# Altium footprint library 7-Connectors-7.PcbLib: 35 footprints (part 1 of 4)
Each footprint in its own frame and in the unit in brackets; x right, y up, seen from the top. Pads: shape width x height; smd on the part's side, far side on the other; paste and mask are expansions set on the pad; w line width, h text height; cw(c..) or ccw(c..) is an arc to the next point about the centre after c.
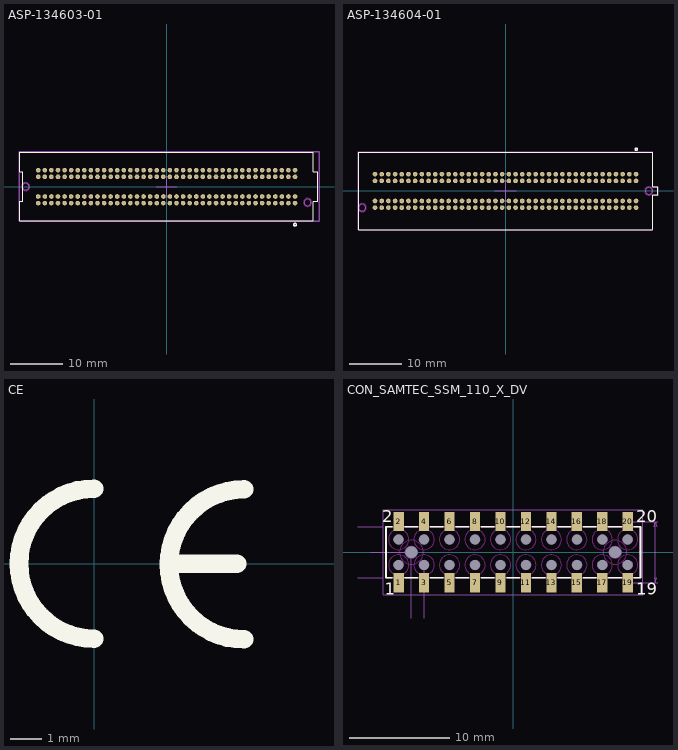
[diagram p0: the footprints below, top view; thin cyan lines are the x and y axes]

## ASP-134603-01 [mm] "母坐"
height 6.72
pads (160):
  round 0.89 hole 0.254: C1(24.765,-3.175) C2(23.495,-3.175) C3(22.225,-3.175) C4(20.955,-3.175) C5(19.685,-3.175) C6(18.415,-3.175) C7(17.145,-3.175) C8(15.875,-3.175) C9(14.605,-3.175) C10(13.335,-3.175) C11(12.065,-3.175) C12(10.795,-3.175) C13(9.525,-3.175) C14(8.255,-3.175) C15(6.985,-3.175) C16(5.715,-3.175) C17(4.445,-3.175) C18(3.175,-3.175) C19(1.905,-3.175) C20(0.635,-3.175) C21(-0.635,-3.175) C22(-1.905,-3.175) C23(-3.175,-3.175) C24(-4.445,-3.175) C25(-5.715,-3.175) C26(-6.985,-3.175) C27(-8.255,-3.175) C28(-9.525,-3.175) C29(-10.795,-3.175) C30(-12.065,-3.175) C31(-13.335,-3.175) C32(-14.605,-3.175) C33(-15.875,-3.175) C34(-17.145,-3.175) C35(-18.415,-3.175) C36(-19.685,-3.175) C37(-20.955,-3.175) C38(-22.225,-3.175) C39(-23.495,-3.175) C40(-24.765,-3.175) D1(24.765,-1.905) D2(23.495,-1.905) D3(22.225,-1.905) D4(20.955,-1.905) D5(19.685,-1.905) D6(18.415,-1.905) D7(17.145,-1.905) D8(15.875,-1.905) D9(14.605,-1.905) D10(13.335,-1.905) D11(12.065,-1.905) D12(10.795,-1.905) D13(9.525,-1.905) D14(8.255,-1.905) D15(6.985,-1.905) D16(5.715,-1.905) D17(4.445,-1.905) D18(3.175,-1.905) D19(1.905,-1.905) D20(0.635,-1.905) D21(-0.635,-1.905) D22(-1.905,-1.905) D23(-3.175,-1.905) D24(-4.445,-1.905) D25(-5.715,-1.905) D26(-6.985,-1.905) D27(-8.255,-1.905) D28(-9.525,-1.905) D29(-10.795,-1.905) D30(-12.065,-1.905) D31(-13.335,-1.905) D32(-14.605,-1.905) D33(-15.875,-1.905) D34(-17.145,-1.905) D35(-18.415,-1.905) D36(-19.685,-1.905) D37(-20.955,-1.905) D38(-22.225,-1.905) D39(-23.495,-1.905) D40(-24.765,-1.905) G1(24.765,1.905) G2(23.495,1.905) G3(22.225,1.905) G4(20.955,1.905) G5(19.685,1.905) G6(18.415,1.905) G7(17.145,1.905) G8(15.875,1.905) G9(14.605,1.905) G10(13.335,1.905) G11(12.065,1.905) G12(10.795,1.905) G13(9.525,1.905) G14(8.255,1.905) G15(6.985,1.905) G16(5.715,1.905) G17(4.445,1.905) G18(3.175,1.905) G19(1.905,1.905) G20(0.635,1.905) G21(-0.635,1.905) G22(-1.905,1.905) G23(-3.175,1.905) G24(-4.445,1.905) G25(-5.715,1.905) G26(-6.985,1.905) G27(-8.255,1.905) G28(-9.525,1.905) G29(-10.795,1.905) G30(-12.065,1.905) G31(-13.335,1.905) G32(-14.605,1.905) G33(-15.875,1.905) G34(-17.145,1.905) G35(-18.415,1.905) G36(-19.685,1.905) G37(-20.955,1.905) G38(-22.225,1.905) G39(-23.495,1.905) G40(-24.765,1.905) H1(24.765,3.175) H2(23.495,3.175) H3(22.225,3.175) H4(20.955,3.175) H5(19.685,3.175) H6(18.415,3.175) H7(17.145,3.175) H8(15.875,3.175) H9(14.605,3.175) H10(13.335,3.175) H11(12.065,3.175) H12(10.795,3.175) H13(9.525,3.175) H14(8.255,3.175) H15(6.985,3.175) H16(5.715,3.175) H17(4.445,3.175) H18(3.175,3.175) H19(1.905,3.175) H20(0.635,3.175) H21(-0.635,3.175) H22(-1.905,3.175) H23(-3.175,3.175) H24(-4.445,3.175) H25(-5.715,3.175) H26(-6.985,3.175) H27(-8.255,3.175) H28(-9.525,3.175) H29(-10.795,3.175) H30(-12.065,3.175) H31(-13.335,3.175) H32(-14.605,3.175) H33(-15.875,3.175) H34(-17.145,3.175) H35(-18.415,3.175) H36(-19.685,3.175) H37(-20.955,3.175) H38(-22.225,3.175) H39(-23.495,3.175) H40(-24.765,3.175)
Top Overlay:
  circle w0.254: c24.765,-7.341 r0.254
  lines w0.1: -28.325,-6.615 -28.325,-2.845 ; -28.325,2.85 -28.325,6.615 ; -28.31,-6.625 28.31,-6.625 ; -28.31,6.625 28.31,6.625 ; -28.296,-2.85 -27.762,-2.85 -27.762,2.85 -28.292,2.85 ; 28.321,-2.85 29.1,-2.85 29.1,2.85 28.325,2.85 28.325,6.615 ; 28.325,-6.615 28.325,-2.87
Keep-Out Layer:
  circle w0.02: c27.178,-3.048 r0.8
  circle w0.02: c-27.178,0 r0.8
Mechanical 1:
  circle w0.1: c27.18,-3.05 r0.65
  circle w0.1: c-27.18,0 r0.65
  lines w0.1: -2,0 2,0 ; 0,-2 0,2
Mechanical 11:
  lines w0.254: 29.388,-6.655 -28.473,-6.655 -28.473,6.68 29.388,6.68 29.388,-6.629
3D body "0_89-0_89-0_55-2_2.stp": height 0.12, standoff -2.08, extent 24.32,1.46 25.21,2.35
3D body "0_89-0_89-0_55-2_2.stp": height 0.12, standoff -2.08, extent 24.32,2.73 25.21,3.62
3D body "0_89-0_89-0_55-2_2.stp": height 0.12, standoff -2.08, extent 23.05,1.46 23.94,2.35
3D body "0_89-0_89-0_55-2_2.stp": height 0.12, standoff -2.08, extent 23.05,2.73 23.94,3.62
3D body "0_89-0_89-0_55-2_2.stp": height 0.12, standoff -2.08, extent 21.78,2.73 22.67,3.62
3D body "0_89-0_89-0_55-2_2.stp": height 0.12, standoff -2.08, extent 21.78,1.46 22.67,2.35
3D body "0_89-0_89-0_55-2_2.stp": height 0.12, standoff -2.08, extent 20.51,1.46 21.4,2.35
3D body "0_89-0_89-0_55-2_2.stp": height 0.12, standoff -2.08, extent 20.51,2.73 21.4,3.62
3D body "0_89-0_89-0_55-2_2.stp": height 0.12, standoff -2.08, extent 24.32,-2.35 25.21,-1.46
3D body "0_89-0_89-0_55-2_2.stp": height 0.12, standoff -2.08, extent 24.32,-3.62 25.21,-2.73
3D body "0_89-0_89-0_55-2_2.stp": height 0.12, standoff -2.08, extent 23.05,-3.62 23.94,-2.73
3D body "0_89-0_89-0_55-2_2.stp": height 0.12, standoff -2.08, extent 23.05,-2.35 23.94,-1.46
3D body "0_89-0_89-0_55-2_2.stp": height 0.12, standoff -2.08, extent 21.78,-2.35 22.67,-1.46
3D body "0_89-0_89-0_55-2_2.stp": height 0.12, standoff -2.08, extent 21.78,-3.62 22.67,-2.73
3D body "0_89-0_89-0_55-2_2.stp": height 0.12, standoff -2.08, extent 20.51,-3.62 21.4,-2.73
3D body "0_89-0_89-0_55-2_2.stp": height 0.12, standoff -2.08, extent 20.51,-2.35 21.4,-1.46
3D body "0_89-0_89-0_55-2_2.stp": height 0.12, standoff -2.08, extent 9.08,1.46 9.97,2.35
3D body "0_89-0_89-0_55-2_2.stp": height 0.12, standoff -2.08, extent 9.08,2.73 9.97,3.62
3D body "0_89-0_89-0_55-2_2.stp": height 0.12, standoff -2.08, extent 10.35,2.73 11.24,3.62
3D body "0_89-0_89-0_55-2_2.stp": height 0.12, standoff -2.08, extent 10.35,1.46 11.24,2.35
3D body "0_89-0_89-0_55-2_2.stp": height 0.12, standoff -2.08, extent 11.62,2.73 12.51,3.62
3D body "0_89-0_89-0_55-2_2.stp": height 0.12, standoff -2.08, extent 11.62,1.46 12.51,2.35
3D body "0_89-0_89-0_55-2_2.stp": height 0.12, standoff -2.08, extent 12.89,1.46 13.78,2.35
3D body "0_89-0_89-0_55-2_2.stp": height 0.12, standoff -2.08, extent 12.89,2.73 13.78,3.62
3D body "0_89-0_89-0_55-2_2.stp": height 0.12, standoff -2.08, extent 14.16,2.73 15.05,3.62
3D body "0_89-0_89-0_55-2_2.stp": height 0.12, standoff -2.08, extent 14.16,1.46 15.05,2.35
3D body "0_89-0_89-0_55-2_2.stp": height 0.12, standoff -2.08, extent 15.43,1.46 16.32,2.35
3D body "0_89-0_89-0_55-2_2.stp": height 0.12, standoff -2.08, extent 15.43,2.73 16.32,3.62
3D body "0_89-0_89-0_55-2_2.stp": height 0.12, standoff -2.08, extent 16.7,2.73 17.59,3.62
3D body "0_89-0_89-0_55-2_2.stp": height 0.12, standoff -2.08, extent 16.7,1.46 17.59,2.35
3D body "0_89-0_89-0_55-2_2.stp": height 0.12, standoff -2.08, extent 17.97,2.73 18.86,3.62
3D body "0_89-0_89-0_55-2_2.stp": height 0.12, standoff -2.08, extent 17.97,1.46 18.86,2.35
3D body "0_89-0_89-0_55-2_2.stp": height 0.12, standoff -2.08, extent 19.24,1.46 20.13,2.35
3D body "0_89-0_89-0_55-2_2.stp": height 0.12, standoff -2.08, extent 19.24,2.73 20.13,3.62
3D body "0_89-0_89-0_55-2_2.stp": height 0.12, standoff -2.08, extent -2.35,1.46 -1.46,2.35
3D body "0_89-0_89-0_55-2_2.stp": height 0.12, standoff -2.08, extent -2.35,2.73 -1.46,3.62
3D body "0_89-0_89-0_55-2_2.stp": height 0.12, standoff -2.08, extent -1.08,2.73 -0.19,3.62
3D body "0_89-0_89-0_55-2_2.stp": height 0.12, standoff -2.08, extent -1.08,1.46 -0.19,2.35
3D body "0_89-0_89-0_55-2_2.stp": height 0.12, standoff -2.08, extent 0.19,2.73 1.08,3.62
3D body "0_89-0_89-0_55-2_2.stp": height 0.12, standoff -2.08, extent 0.19,1.46 1.08,2.35
3D body "0_89-0_89-0_55-2_2.stp": height 0.12, standoff -2.08, extent 1.46,1.46 2.35,2.35
3D body "0_89-0_89-0_55-2_2.stp": height 0.12, standoff -2.08, extent 1.46,2.73 2.35,3.62
3D body "0_89-0_89-0_55-2_2.stp": height 0.12, standoff -2.08, extent 2.73,2.73 3.62,3.62
3D body "0_89-0_89-0_55-2_2.stp": height 0.12, standoff -2.08, extent 2.73,1.46 3.62,2.35
3D body "0_89-0_89-0_55-2_2.stp": height 0.12, standoff -2.08, extent 4,1.46 4.89,2.35
3D body "0_89-0_89-0_55-2_2.stp": height 0.12, standoff -2.08, extent 4,2.73 4.89,3.62
3D body "0_89-0_89-0_55-2_2.stp": height 0.12, standoff -2.08, extent 5.27,2.73 6.16,3.62
3D body "0_89-0_89-0_55-2_2.stp": height 0.12, standoff -2.08, extent 5.27,1.46 6.16,2.35
3D body "0_89-0_89-0_55-2_2.stp": height 0.12, standoff -2.08, extent 6.54,2.73 7.43,3.62
3D body "0_89-0_89-0_55-2_2.stp": height 0.12, standoff -2.08, extent 6.54,1.46 7.43,2.35
3D body "0_89-0_89-0_55-2_2.stp": height 0.12, standoff -2.08, extent 7.81,1.46 8.7,2.35
3D body "0_89-0_89-0_55-2_2.stp": height 0.12, standoff -2.08, extent 7.81,2.73 8.7,3.62
3D body "0_89-0_89-0_55-2_2.stp": height 0.12, standoff -2.08, extent -13.78,1.46 -12.89,2.35
3D body "0_89-0_89-0_55-2_2.stp": height 0.12, standoff -2.08, extent -13.78,2.73 -12.89,3.62
3D body "0_89-0_89-0_55-2_2.stp": height 0.12, standoff -2.08, extent -12.51,2.73 -11.62,3.62
3D body "0_89-0_89-0_55-2_2.stp": height 0.12, standoff -2.08, extent -12.51,1.46 -11.62,2.35
3D body "0_89-0_89-0_55-2_2.stp": height 0.12, standoff -2.08, extent -11.24,2.73 -10.35,3.62
3D body "0_89-0_89-0_55-2_2.stp": height 0.12, standoff -2.08, extent -11.24,1.46 -10.35,2.35
3D body "0_89-0_89-0_55-2_2.stp": height 0.12, standoff -2.08, extent -9.97,1.46 -9.08,2.35
3D body "0_89-0_89-0_55-2_2.stp": height 0.12, standoff -2.08, extent -9.97,2.73 -9.08,3.62
3D body "0_89-0_89-0_55-2_2.stp": height 0.12, standoff -2.08, extent -8.7,2.73 -7.81,3.62
3D body "0_89-0_89-0_55-2_2.stp": height 0.12, standoff -2.08, extent -8.7,1.46 -7.81,2.35
3D body "0_89-0_89-0_55-2_2.stp": height 0.12, standoff -2.08, extent -7.43,1.46 -6.54,2.35
3D body "0_89-0_89-0_55-2_2.stp": height 0.12, standoff -2.08, extent -7.43,2.73 -6.54,3.62
3D body "0_89-0_89-0_55-2_2.stp": height 0.12, standoff -2.08, extent -6.16,2.73 -5.27,3.62
3D body "0_89-0_89-0_55-2_2.stp": height 0.12, standoff -2.08, extent -6.16,1.46 -5.27,2.35
3D body "0_89-0_89-0_55-2_2.stp": height 0.12, standoff -2.08, extent -4.89,2.73 -4,3.62
3D body "0_89-0_89-0_55-2_2.stp": height 0.12, standoff -2.08, extent -4.89,1.46 -4,2.35
3D body "0_89-0_89-0_55-2_2.stp": height 0.12, standoff -2.08, extent -3.62,1.46 -2.73,2.35
3D body "0_89-0_89-0_55-2_2.stp": height 0.12, standoff -2.08, extent -3.62,2.73 -2.73,3.62
3D body "0_89-0_89-0_55-2_2.stp": height 0.12, standoff -2.08, extent -25.21,1.46 -24.32,2.35
3D body "0_89-0_89-0_55-2_2.stp": height 0.12, standoff -2.08, extent -25.21,2.73 -24.32,3.62
3D body "0_89-0_89-0_55-2_2.stp": height 0.12, standoff -2.08, extent -23.94,2.73 -23.05,3.62
3D body "0_89-0_89-0_55-2_2.stp": height 0.12, standoff -2.08, extent -23.94,1.46 -23.05,2.35
3D body "0_89-0_89-0_55-2_2.stp": height 0.12, standoff -2.08, extent -22.67,2.73 -21.78,3.62
3D body "0_89-0_89-0_55-2_2.stp": height 0.12, standoff -2.08, extent -22.67,1.46 -21.78,2.35
3D body "0_89-0_89-0_55-2_2.stp": height 0.12, standoff -2.08, extent -21.4,1.46 -20.51,2.35
3D body "0_89-0_89-0_55-2_2.stp": height 0.12, standoff -2.08, extent -21.4,2.73 -20.51,3.62
3D body "0_89-0_89-0_55-2_2.stp": height 0.12, standoff -2.08, extent -20.13,2.73 -19.24,3.62
3D body "0_89-0_89-0_55-2_2.stp": height 0.12, standoff -2.08, extent -20.13,1.46 -19.24,2.35
3D body "0_89-0_89-0_55-2_2.stp": height 0.12, standoff -2.08, extent -18.86,1.46 -17.97,2.35
3D body "0_89-0_89-0_55-2_2.stp": height 0.12, standoff -2.08, extent -18.86,2.73 -17.97,3.62
3D body "0_89-0_89-0_55-2_2.stp": height 0.12, standoff -2.08, extent -17.59,2.73 -16.7,3.62
3D body "0_89-0_89-0_55-2_2.stp": height 0.12, standoff -2.08, extent -17.59,1.46 -16.7,2.35
3D body "0_89-0_89-0_55-2_2.stp": height 0.12, standoff -2.08, extent -16.32,2.73 -15.43,3.62
3D body "0_89-0_89-0_55-2_2.stp": height 0.12, standoff -2.08, extent -16.32,1.46 -15.43,2.35
3D body "0_89-0_89-0_55-2_2.stp": height 0.12, standoff -2.08, extent -15.05,1.46 -14.16,2.35
3D body "0_89-0_89-0_55-2_2.stp": height 0.12, standoff -2.08, extent -15.05,2.73 -14.16,3.62
3D body "0_89-0_89-0_55-2_2.stp": height 0.12, standoff -2.08, extent 9.08,-3.62 9.97,-2.73
3D body "0_89-0_89-0_55-2_2.stp": height 0.12, standoff -2.08, extent 9.08,-2.35 9.97,-1.46
3D body "0_89-0_89-0_55-2_2.stp": height 0.12, standoff -2.08, extent 10.35,-2.35 11.24,-1.46
3D body "0_89-0_89-0_55-2_2.stp": height 0.12, standoff -2.08, extent 10.35,-3.62 11.24,-2.73
3D body "0_89-0_89-0_55-2_2.stp": height 0.12, standoff -2.08, extent 11.62,-2.35 12.51,-1.46
3D body "0_89-0_89-0_55-2_2.stp": height 0.12, standoff -2.08, extent 11.62,-3.62 12.51,-2.73
3D body "0_89-0_89-0_55-2_2.stp": height 0.12, standoff -2.08, extent 12.89,-3.62 13.78,-2.73
3D body "0_89-0_89-0_55-2_2.stp": height 0.12, standoff -2.08, extent 12.89,-2.35 13.78,-1.46
3D body "0_89-0_89-0_55-2_2.stp": height 0.12, standoff -2.08, extent 14.16,-2.35 15.05,-1.46
3D body "0_89-0_89-0_55-2_2.stp": height 0.12, standoff -2.08, extent 14.16,-3.62 15.05,-2.73
3D body "0_89-0_89-0_55-2_2.stp": height 0.12, standoff -2.08, extent 15.43,-3.62 16.32,-2.73
3D body "0_89-0_89-0_55-2_2.stp": height 0.12, standoff -2.08, extent 15.43,-2.35 16.32,-1.46
3D body "0_89-0_89-0_55-2_2.stp": height 0.12, standoff -2.08, extent 16.7,-2.35 17.59,-1.46
3D body "0_89-0_89-0_55-2_2.stp": height 0.12, standoff -2.08, extent 16.7,-3.62 17.59,-2.73
3D body "0_89-0_89-0_55-2_2.stp": height 0.12, standoff -2.08, extent 17.97,-2.35 18.86,-1.46
3D body "0_89-0_89-0_55-2_2.stp": height 0.12, standoff -2.08, extent 17.97,-3.62 18.86,-2.73
3D body "0_89-0_89-0_55-2_2.stp": height 0.12, standoff -2.08, extent 19.24,-3.62 20.13,-2.73
3D body "0_89-0_89-0_55-2_2.stp": height 0.12, standoff -2.08, extent 19.24,-2.35 20.13,-1.46
3D body "0_89-0_89-0_55-2_2.stp": height 0.12, standoff -2.08, extent -2.35,-3.62 -1.46,-2.73
3D body "0_89-0_89-0_55-2_2.stp": height 0.12, standoff -2.08, extent -2.35,-2.35 -1.46,-1.46
3D body "0_89-0_89-0_55-2_2.stp": height 0.12, standoff -2.08, extent -1.08,-2.35 -0.19,-1.46
3D body "0_89-0_89-0_55-2_2.stp": height 0.12, standoff -2.08, extent -1.08,-3.62 -0.19,-2.73
3D body "0_89-0_89-0_55-2_2.stp": height 0.12, standoff -2.08, extent 0.19,-2.35 1.08,-1.46
3D body "0_89-0_89-0_55-2_2.stp": height 0.12, standoff -2.08, extent 0.19,-3.62 1.08,-2.73
3D body "0_89-0_89-0_55-2_2.stp": height 0.12, standoff -2.08, extent 1.46,-3.62 2.35,-2.73
3D body "0_89-0_89-0_55-2_2.stp": height 0.12, standoff -2.08, extent 1.46,-2.35 2.35,-1.46
3D body "0_89-0_89-0_55-2_2.stp": height 0.12, standoff -2.08, extent 2.73,-2.35 3.62,-1.46
3D body "0_89-0_89-0_55-2_2.stp": height 0.12, standoff -2.08, extent 2.73,-3.62 3.62,-2.73
3D body "0_89-0_89-0_55-2_2.stp": height 0.12, standoff -2.08, extent 4,-3.62 4.89,-2.73
3D body "0_89-0_89-0_55-2_2.stp": height 0.12, standoff -2.08, extent 4,-2.35 4.89,-1.46
3D body "0_89-0_89-0_55-2_2.stp": height 0.12, standoff -2.08, extent 5.27,-2.35 6.16,-1.46
3D body "0_89-0_89-0_55-2_2.stp": height 0.12, standoff -2.08, extent 5.27,-3.62 6.16,-2.73
3D body "0_89-0_89-0_55-2_2.stp": height 0.12, standoff -2.08, extent 6.54,-2.35 7.43,-1.46
3D body "0_89-0_89-0_55-2_2.stp": height 0.12, standoff -2.08, extent 6.54,-3.62 7.43,-2.73
3D body "0_89-0_89-0_55-2_2.stp": height 0.12, standoff -2.08, extent 7.81,-3.62 8.7,-2.73
3D body "0_89-0_89-0_55-2_2.stp": height 0.12, standoff -2.08, extent 7.81,-2.35 8.7,-1.46
3D body "0_89-0_89-0_55-2_2.stp": height 0.12, standoff -2.08, extent -13.78,-3.62 -12.89,-2.73
3D body "0_89-0_89-0_55-2_2.stp": height 0.12, standoff -2.08, extent -13.78,-2.35 -12.89,-1.46
3D body "0_89-0_89-0_55-2_2.stp": height 0.12, standoff -2.08, extent -12.51,-2.35 -11.62,-1.46
3D body "0_89-0_89-0_55-2_2.stp": height 0.12, standoff -2.08, extent -12.51,-3.62 -11.62,-2.73
3D body "0_89-0_89-0_55-2_2.stp": height 0.12, standoff -2.08, extent -11.24,-2.35 -10.35,-1.46
3D body "0_89-0_89-0_55-2_2.stp": height 0.12, standoff -2.08, extent -11.24,-3.62 -10.35,-2.73
3D body "0_89-0_89-0_55-2_2.stp": height 0.12, standoff -2.08, extent -9.97,-3.62 -9.08,-2.73
3D body "0_89-0_89-0_55-2_2.stp": height 0.12, standoff -2.08, extent -9.97,-2.35 -9.08,-1.46
3D body "0_89-0_89-0_55-2_2.stp": height 0.12, standoff -2.08, extent -8.7,-2.35 -7.81,-1.46
3D body "0_89-0_89-0_55-2_2.stp": height 0.12, standoff -2.08, extent -8.7,-3.62 -7.81,-2.73
3D body "0_89-0_89-0_55-2_2.stp": height 0.12, standoff -2.08, extent -7.43,-3.62 -6.54,-2.73
3D body "0_89-0_89-0_55-2_2.stp": height 0.12, standoff -2.08, extent -7.43,-2.35 -6.54,-1.46
3D body "0_89-0_89-0_55-2_2.stp": height 0.12, standoff -2.08, extent -6.16,-2.35 -5.27,-1.46
3D body "0_89-0_89-0_55-2_2.stp": height 0.12, standoff -2.08, extent -6.16,-3.62 -5.27,-2.73
3D body "0_89-0_89-0_55-2_2.stp": height 0.12, standoff -2.08, extent -4.89,-2.35 -4,-1.46
3D body "0_89-0_89-0_55-2_2.stp": height 0.12, standoff -2.08, extent -4.89,-3.62 -4,-2.73
3D body "0_89-0_89-0_55-2_2.stp": height 0.12, standoff -2.08, extent -3.62,-3.62 -2.73,-2.73
3D body "0_89-0_89-0_55-2_2.stp": height 0.12, standoff -2.08, extent -3.62,-2.35 -2.73,-1.46
3D body "0_89-0_89-0_55-2_2.stp": height 0.12, standoff -2.08, extent -15.05,-2.35 -14.16,-1.46
3D body "0_89-0_89-0_55-2_2.stp": height 0.12, standoff -2.08, extent -15.05,-3.62 -14.16,-2.73
3D body "0_89-0_89-0_55-2_2.stp": height 0.12, standoff -2.08, extent -16.32,-3.62 -15.43,-2.73
3D body "0_89-0_89-0_55-2_2.stp": height 0.12, standoff -2.08, extent -16.32,-2.35 -15.43,-1.46
3D body "0_89-0_89-0_55-2_2.stp": height 0.12, standoff -2.08, extent -17.59,-3.62 -16.7,-2.73
3D body "0_89-0_89-0_55-2_2.stp": height 0.12, standoff -2.08, extent -17.59,-2.35 -16.7,-1.46
3D body "0_89-0_89-0_55-2_2.stp": height 0.12, standoff -2.08, extent -18.86,-2.35 -17.97,-1.46
3D body "0_89-0_89-0_55-2_2.stp": height 0.12, standoff -2.08, extent -18.86,-3.62 -17.97,-2.73
3D body "0_89-0_89-0_55-2_2.stp": height 0.12, standoff -2.08, extent -20.13,-3.62 -19.24,-2.73
3D body "0_89-0_89-0_55-2_2.stp": height 0.12, standoff -2.08, extent -20.13,-2.35 -19.24,-1.46
3D body "0_89-0_89-0_55-2_2.stp": height 0.12, standoff -2.08, extent -21.4,-2.35 -20.51,-1.46
3D body "0_89-0_89-0_55-2_2.stp": height 0.12, standoff -2.08, extent -21.4,-3.62 -20.51,-2.73
3D body "0_89-0_89-0_55-2_2.stp": height 0.12, standoff -2.08, extent -22.67,-3.62 -21.78,-2.73
3D body "0_89-0_89-0_55-2_2.stp": height 0.12, standoff -2.08, extent -22.67,-2.35 -21.78,-1.46
3D body "0_89-0_89-0_55-2_2.stp": height 0.12, standoff -2.08, extent -23.94,-3.62 -23.05,-2.73
3D body "0_89-0_89-0_55-2_2.stp": height 0.12, standoff -2.08, extent -23.94,-2.35 -23.05,-1.46
3D body "0_89-0_89-0_55-2_2.stp": height 0.12, standoff -2.08, extent -25.21,-2.35 -24.32,-1.46
3D body "asp-134603-01m.stp": height 6.6, standoff -1.58, extent -28.3,-6.645 29.18,6.625
3D body "0_89-0_89-0_55-2_2.stp": height 0.12, standoff -2.08, extent -25.21,-3.62 -24.32,-2.73

## ASP-134604-01 [mm] "公头"
height 6.72
pads (160):
  round 0.89 hole 0.254: C1(24.765,3.175) C2(23.495,3.175) C3(22.225,3.175) C4(20.955,3.175) C5(19.685,3.175) C6(18.415,3.175) C7(17.145,3.175) C8(15.875,3.175) C9(14.605,3.175) C10(13.335,3.175) C11(12.065,3.175) C12(10.795,3.175) C13(9.525,3.175) C14(8.255,3.175) C15(6.985,3.175) C16(5.715,3.175) C17(4.445,3.175) C18(3.175,3.175) C19(1.905,3.175) C20(0.635,3.175) C21(-0.635,3.175) C22(-1.905,3.175) C23(-3.175,3.175) C24(-4.445,3.175) C25(-5.715,3.175) C26(-6.985,3.175) C27(-8.255,3.175) C28(-9.525,3.175) C29(-10.795,3.175) C30(-12.065,3.175) C31(-13.335,3.175) C32(-14.605,3.175) C33(-15.875,3.175) C34(-17.145,3.175) C35(-18.415,3.175) C36(-19.685,3.175) C37(-20.955,3.175) C38(-22.225,3.175) C39(-23.495,3.175) C40(-24.765,3.175) D1(24.765,1.905) D2(23.495,1.905) D3(22.225,1.905) D4(20.955,1.905) D5(19.685,1.905) D6(18.415,1.905) D7(17.145,1.905) D8(15.875,1.905) D9(14.605,1.905) D10(13.335,1.905) D11(12.065,1.905) D12(10.795,1.905) D13(9.525,1.905) D14(8.255,1.905) D15(6.985,1.905) D16(5.715,1.905) D17(4.445,1.905) D18(3.175,1.905) D19(1.905,1.905) D20(0.635,1.905) D21(-0.635,1.905) D22(-1.905,1.905) D23(-3.175,1.905) D24(-4.445,1.905) D25(-5.715,1.905) D26(-6.985,1.905) D27(-8.255,1.905) D28(-9.525,1.905) D29(-10.795,1.905) D30(-12.065,1.905) D31(-13.335,1.905) D32(-14.605,1.905) D33(-15.875,1.905) D34(-17.145,1.905) D35(-18.415,1.905) D36(-19.685,1.905) D37(-20.955,1.905) D38(-22.225,1.905) D39(-23.495,1.905) D40(-24.765,1.905) G1(24.765,-1.905) G2(23.495,-1.905) G3(22.225,-1.905) G4(20.955,-1.905) G5(19.685,-1.905) G6(18.415,-1.905) G7(17.145,-1.905) G8(15.875,-1.905) G9(14.605,-1.905) G10(13.335,-1.905) G11(12.065,-1.905) G12(10.795,-1.905) G13(9.525,-1.905) G14(8.255,-1.905) G15(6.985,-1.905) G16(5.715,-1.905) G17(4.445,-1.905) G18(3.175,-1.905) G19(1.905,-1.905) G20(0.635,-1.905) G21(-0.635,-1.905) G22(-1.905,-1.905) G23(-3.175,-1.905) G24(-4.445,-1.905) G25(-5.715,-1.905) G26(-6.985,-1.905) G27(-8.255,-1.905) G28(-9.525,-1.905) G29(-10.795,-1.905) G30(-12.065,-1.905) G31(-13.335,-1.905) G32(-14.605,-1.905) G33(-15.875,-1.905) G34(-17.145,-1.905) G35(-18.415,-1.905) G36(-19.685,-1.905) G37(-20.955,-1.905) G38(-22.225,-1.905) G39(-23.495,-1.905) G40(-24.765,-1.905) H1(24.765,-3.175) H2(23.495,-3.175) H3(22.225,-3.175) H4(20.955,-3.175) H5(19.685,-3.175) H6(18.415,-3.175) H7(17.145,-3.175) H8(15.875,-3.175) H9(14.605,-3.175) H10(13.335,-3.175) H11(12.065,-3.175) H12(10.795,-3.175) H13(9.525,-3.175) H14(8.255,-3.175) H15(6.985,-3.175) H16(5.715,-3.175) H17(4.445,-3.175) H18(3.175,-3.175) H19(1.905,-3.175) H20(0.635,-3.175) H21(-0.635,-3.175) H22(-1.905,-3.175) H23(-3.175,-3.175) H24(-4.445,-3.175) H25(-5.715,-3.175) H26(-6.985,-3.175) H27(-8.255,-3.175) H28(-9.525,-3.175) H29(-10.795,-3.175) H30(-12.065,-3.175) H31(-13.335,-3.175) H32(-14.605,-3.175) H33(-15.875,-3.175) H34(-17.145,-3.175) H35(-18.415,-3.175) H36(-19.685,-3.175) H37(-20.955,-3.175) H38(-22.225,-3.175) H39(-23.495,-3.175) H40(-24.765,-3.175)
Top Overlay:
  circle w0.254: c24.79,7.899 r0.218
  lines w0.1: 27.88,-7.33 -27.88,-7.33 -27.88,7.33 27.88,7.33 ; 27.889,-0.76 28.854,-0.76 28.854,0.76 27.89,0.76 27.89,7.33 ; 27.89,-7.315 27.89,-0.787
Keep-Out Layer:
  circle w0.02: c-27.19,-3.175 r0.8
  circle w0.02: c27.19,0 r0.8
Mechanical 1:
  circle w0.1: c-27.19,-3.175 r0.65
  circle w0.1: c27.19,0 r0.65
  lines w0.1: -2,0 2,0 ; 0,-2 0,2
Mechanical 11:
  lines w0.1: -27.965,-7.391 27.965,-7.391 27.965,-0.864 28.931,-0.864 28.931,0.813 27.965,0.813 27.965,3.715 27.965,7.417 -27.965,7.417 -27.965,-7.391
3D body "asp-134604-01g.stp": height 6, standoff -1.1, extent -27.875,-7.325 28.735,7.325
3D body "0_89-0_89-0_6.stp": height 0.05, standoff -2.15, extent -25.21,2.73 -24.32,3.62
3D body "0_89-0_89-0_6.stp": height 0.05, standoff -2.15, extent -23.94,2.73 -23.05,3.62
3D body "0_89-0_89-0_6.stp": height 0.05, standoff -2.15, extent -22.67,2.73 -21.78,3.62
3D body "0_89-0_89-0_6.stp": height 0.05, standoff -2.15, extent -21.4,2.73 -20.51,3.62
3D body "0_89-0_89-0_6.stp": height 0.05, standoff -2.15, extent -20.13,2.73 -19.24,3.62
3D body "0_89-0_89-0_6.stp": height 0.05, standoff -2.15, extent -18.86,2.73 -17.97,3.62
3D body "0_89-0_89-0_6.stp": height 0.05, standoff -2.15, extent -17.59,2.73 -16.7,3.62
3D body "0_89-0_89-0_6.stp": height 0.05, standoff -2.15, extent -16.32,2.73 -15.43,3.62
3D body "0_89-0_89-0_6.stp": height 0.05, standoff -2.15, extent -16.32,1.46 -15.43,2.35
3D body "0_89-0_89-0_6.stp": height 0.05, standoff -2.15, extent -17.59,1.46 -16.7,2.35
3D body "0_89-0_89-0_6.stp": height 0.05, standoff -2.15, extent -18.86,1.46 -17.97,2.35
3D body "0_89-0_89-0_6.stp": height 0.05, standoff -2.15, extent -20.13,1.46 -19.24,2.35
3D body "0_89-0_89-0_6.stp": height 0.05, standoff -2.15, extent -21.4,1.46 -20.51,2.35
3D body "0_89-0_89-0_6.stp": height 0.05, standoff -2.15, extent -22.67,1.46 -21.78,2.35
3D body "0_89-0_89-0_6.stp": height 0.05, standoff -2.15, extent -23.94,1.46 -23.05,2.35
3D body "0_89-0_89-0_6.stp": height 0.05, standoff -2.15, extent -25.21,1.46 -24.32,2.35
3D body "0_89-0_89-0_6.stp": height 0.05, standoff -2.15, extent -6.16,1.46 -5.27,2.35
3D body "0_89-0_89-0_6.stp": height 0.05, standoff -2.15, extent -7.43,1.46 -6.54,2.35
3D body "0_89-0_89-0_6.stp": height 0.05, standoff -2.15, extent -8.7,1.46 -7.81,2.35
3D body "0_89-0_89-0_6.stp": height 0.05, standoff -2.15, extent -9.97,1.46 -9.08,2.35
3D body "0_89-0_89-0_6.stp": height 0.05, standoff -2.15, extent -11.24,1.46 -10.35,2.35
3D body "0_89-0_89-0_6.stp": height 0.05, standoff -2.15, extent -12.51,1.46 -11.62,2.35
3D body "0_89-0_89-0_6.stp": height 0.05, standoff -2.15, extent -13.78,1.46 -12.89,2.35
3D body "0_89-0_89-0_6.stp": height 0.05, standoff -2.15, extent -15.05,1.46 -14.16,2.35
3D body "0_89-0_89-0_6.stp": height 0.05, standoff -2.15, extent -6.16,2.73 -5.27,3.62
3D body "0_89-0_89-0_6.stp": height 0.05, standoff -2.15, extent -7.43,2.73 -6.54,3.62
3D body "0_89-0_89-0_6.stp": height 0.05, standoff -2.15, extent -8.7,2.73 -7.81,3.62
3D body "0_89-0_89-0_6.stp": height 0.05, standoff -2.15, extent -9.97,2.73 -9.08,3.62
3D body "0_89-0_89-0_6.stp": height 0.05, standoff -2.15, extent -11.24,2.73 -10.35,3.62
3D body "0_89-0_89-0_6.stp": height 0.05, standoff -2.15, extent -12.51,2.73 -11.62,3.62
3D body "0_89-0_89-0_6.stp": height 0.05, standoff -2.15, extent -13.78,2.73 -12.89,3.62
3D body "0_89-0_89-0_6.stp": height 0.05, standoff -2.15, extent -15.05,2.73 -14.16,3.62
3D body "0_89-0_89-0_6.stp": height 0.05, standoff -2.15, extent 4,2.73 4.89,3.62
3D body "0_89-0_89-0_6.stp": height 0.05, standoff -2.15, extent 2.73,2.73 3.62,3.62
3D body "0_89-0_89-0_6.stp": height 0.05, standoff -2.15, extent 1.46,2.73 2.35,3.62
3D body "0_89-0_89-0_6.stp": height 0.05, standoff -2.15, extent 0.19,2.73 1.08,3.62
3D body "0_89-0_89-0_6.stp": height 0.05, standoff -2.15, extent -1.08,2.73 -0.19,3.62
3D body "0_89-0_89-0_6.stp": height 0.05, standoff -2.15, extent -2.35,2.73 -1.46,3.62
3D body "0_89-0_89-0_6.stp": height 0.05, standoff -2.15, extent -3.62,2.73 -2.73,3.62
3D body "0_89-0_89-0_6.stp": height 0.05, standoff -2.15, extent -4.89,2.73 -4,3.62
3D body "0_89-0_89-0_6.stp": height 0.05, standoff -2.15, extent 4,1.46 4.89,2.35
3D body "0_89-0_89-0_6.stp": height 0.05, standoff -2.15, extent 2.73,1.46 3.62,2.35
3D body "0_89-0_89-0_6.stp": height 0.05, standoff -2.15, extent 1.46,1.46 2.35,2.35
3D body "0_89-0_89-0_6.stp": height 0.05, standoff -2.15, extent 0.19,1.46 1.08,2.35
3D body "0_89-0_89-0_6.stp": height 0.05, standoff -2.15, extent -1.08,1.46 -0.19,2.35
3D body "0_89-0_89-0_6.stp": height 0.05, standoff -2.15, extent -2.35,1.46 -1.46,2.35
3D body "0_89-0_89-0_6.stp": height 0.05, standoff -2.15, extent -3.62,1.46 -2.73,2.35
3D body "0_89-0_89-0_6.stp": height 0.05, standoff -2.15, extent -4.89,1.46 -4,2.35
3D body "0_89-0_89-0_6.stp": height 0.05, standoff -2.15, extent 14.16,2.73 15.05,3.62
3D body "0_89-0_89-0_6.stp": height 0.05, standoff -2.15, extent 12.89,2.73 13.78,3.62
3D body "0_89-0_89-0_6.stp": height 0.05, standoff -2.15, extent 11.62,2.73 12.51,3.62
3D body "0_89-0_89-0_6.stp": height 0.05, standoff -2.15, extent 10.35,2.73 11.24,3.62
3D body "0_89-0_89-0_6.stp": height 0.05, standoff -2.15, extent 9.08,2.73 9.97,3.62
3D body "0_89-0_89-0_6.stp": height 0.05, standoff -2.15, extent 7.81,2.73 8.7,3.62
3D body "0_89-0_89-0_6.stp": height 0.05, standoff -2.15, extent 6.54,2.73 7.43,3.62
3D body "0_89-0_89-0_6.stp": height 0.05, standoff -2.15, extent 5.27,2.73 6.16,3.62
3D body "0_89-0_89-0_6.stp": height 0.05, standoff -2.15, extent 14.16,1.46 15.05,2.35
3D body "0_89-0_89-0_6.stp": height 0.05, standoff -2.15, extent 12.89,1.46 13.78,2.35
3D body "0_89-0_89-0_6.stp": height 0.05, standoff -2.15, extent 11.62,1.46 12.51,2.35
3D body "0_89-0_89-0_6.stp": height 0.05, standoff -2.15, extent 10.35,1.46 11.24,2.35
3D body "0_89-0_89-0_6.stp": height 0.05, standoff -2.15, extent 9.08,1.46 9.97,2.35
3D body "0_89-0_89-0_6.stp": height 0.05, standoff -2.15, extent 7.81,1.46 8.7,2.35
3D body "0_89-0_89-0_6.stp": height 0.05, standoff -2.15, extent 6.54,1.46 7.43,2.35
3D body "0_89-0_89-0_6.stp": height 0.05, standoff -2.15, extent 5.27,1.46 6.16,2.35
3D body "0_89-0_89-0_6.stp": height 0.05, standoff -2.15, extent 24.32,2.73 25.21,3.62
3D body "0_89-0_89-0_6.stp": height 0.05, standoff -2.15, extent 23.05,2.73 23.94,3.62
3D body "0_89-0_89-0_6.stp": height 0.05, standoff -2.15, extent 21.78,2.73 22.67,3.62
3D body "0_89-0_89-0_6.stp": height 0.05, standoff -2.15, extent 20.51,2.73 21.4,3.62
3D body "0_89-0_89-0_6.stp": height 0.05, standoff -2.15, extent 19.24,2.73 20.13,3.62
3D body "0_89-0_89-0_6.stp": height 0.05, standoff -2.15, extent 17.97,2.73 18.86,3.62
3D body "0_89-0_89-0_6.stp": height 0.05, standoff -2.15, extent 16.7,2.73 17.59,3.62
3D body "0_89-0_89-0_6.stp": height 0.05, standoff -2.15, extent 15.43,2.73 16.32,3.62
3D body "0_89-0_89-0_6.stp": height 0.05, standoff -2.15, extent 24.32,1.46 25.21,2.35
3D body "0_89-0_89-0_6.stp": height 0.05, standoff -2.15, extent 23.05,1.46 23.94,2.35
3D body "0_89-0_89-0_6.stp": height 0.05, standoff -2.15, extent 21.78,1.46 22.67,2.35
3D body "0_89-0_89-0_6.stp": height 0.05, standoff -2.15, extent 20.51,1.46 21.4,2.35
3D body "0_89-0_89-0_6.stp": height 0.05, standoff -2.15, extent 19.24,1.46 20.13,2.35
3D body "0_89-0_89-0_6.stp": height 0.05, standoff -2.15, extent 17.97,1.46 18.86,2.35
3D body "0_89-0_89-0_6.stp": height 0.05, standoff -2.15, extent 16.7,1.46 17.59,2.35
3D body "0_89-0_89-0_6.stp": height 0.05, standoff -2.15, extent 15.43,1.46 16.32,2.35
3D body "0_89-0_89-0_6.stp": height 0.05, standoff -2.15, extent 15.43,-3.62 16.32,-2.73
3D body "0_89-0_89-0_6.stp": height 0.05, standoff -2.15, extent 16.7,-3.62 17.59,-2.73
3D body "0_89-0_89-0_6.stp": height 0.05, standoff -2.15, extent 17.97,-3.62 18.86,-2.73
3D body "0_89-0_89-0_6.stp": height 0.05, standoff -2.15, extent 19.24,-3.62 20.13,-2.73
3D body "0_89-0_89-0_6.stp": height 0.05, standoff -2.15, extent 20.51,-3.62 21.4,-2.73
3D body "0_89-0_89-0_6.stp": height 0.05, standoff -2.15, extent 21.78,-3.62 22.67,-2.73
3D body "0_89-0_89-0_6.stp": height 0.05, standoff -2.15, extent 23.05,-3.62 23.94,-2.73
3D body "0_89-0_89-0_6.stp": height 0.05, standoff -2.15, extent 24.32,-3.62 25.21,-2.73
3D body "0_89-0_89-0_6.stp": height 0.05, standoff -2.15, extent 15.43,-2.35 16.32,-1.46
3D body "0_89-0_89-0_6.stp": height 0.05, standoff -2.15, extent 16.7,-2.35 17.59,-1.46
3D body "0_89-0_89-0_6.stp": height 0.05, standoff -2.15, extent 17.97,-2.35 18.86,-1.46
3D body "0_89-0_89-0_6.stp": height 0.05, standoff -2.15, extent 19.24,-2.35 20.13,-1.46
3D body "0_89-0_89-0_6.stp": height 0.05, standoff -2.15, extent 20.51,-2.35 21.4,-1.46
3D body "0_89-0_89-0_6.stp": height 0.05, standoff -2.15, extent 21.78,-2.35 22.67,-1.46
3D body "0_89-0_89-0_6.stp": height 0.05, standoff -2.15, extent 23.05,-2.35 23.94,-1.46
3D body "0_89-0_89-0_6.stp": height 0.05, standoff -2.15, extent 24.32,-2.35 25.21,-1.46
3D body "0_89-0_89-0_6.stp": height 0.05, standoff -2.15, extent 5.27,-3.62 6.16,-2.73
3D body "0_89-0_89-0_6.stp": height 0.05, standoff -2.15, extent 6.54,-3.62 7.43,-2.73
3D body "0_89-0_89-0_6.stp": height 0.05, standoff -2.15, extent 7.81,-3.62 8.7,-2.73
3D body "0_89-0_89-0_6.stp": height 0.05, standoff -2.15, extent 9.08,-3.62 9.97,-2.73
3D body "0_89-0_89-0_6.stp": height 0.05, standoff -2.15, extent 10.35,-3.62 11.24,-2.73
3D body "0_89-0_89-0_6.stp": height 0.05, standoff -2.15, extent 11.62,-3.62 12.51,-2.73
3D body "0_89-0_89-0_6.stp": height 0.05, standoff -2.15, extent 12.89,-3.62 13.78,-2.73
3D body "0_89-0_89-0_6.stp": height 0.05, standoff -2.15, extent 14.16,-3.62 15.05,-2.73
3D body "0_89-0_89-0_6.stp": height 0.05, standoff -2.15, extent 5.27,-2.35 6.16,-1.46
3D body "0_89-0_89-0_6.stp": height 0.05, standoff -2.15, extent 6.54,-2.35 7.43,-1.46
3D body "0_89-0_89-0_6.stp": height 0.05, standoff -2.15, extent 7.81,-2.35 8.7,-1.46
3D body "0_89-0_89-0_6.stp": height 0.05, standoff -2.15, extent 9.08,-2.35 9.97,-1.46
3D body "0_89-0_89-0_6.stp": height 0.05, standoff -2.15, extent 10.35,-2.35 11.24,-1.46
3D body "0_89-0_89-0_6.stp": height 0.05, standoff -2.15, extent 11.62,-2.35 12.51,-1.46
3D body "0_89-0_89-0_6.stp": height 0.05, standoff -2.15, extent 12.89,-2.35 13.78,-1.46
3D body "0_89-0_89-0_6.stp": height 0.05, standoff -2.15, extent 14.16,-2.35 15.05,-1.46
3D body "0_89-0_89-0_6.stp": height 0.05, standoff -2.15, extent -4.89,-3.62 -4,-2.73
3D body "0_89-0_89-0_6.stp": height 0.05, standoff -2.15, extent -3.62,-3.62 -2.73,-2.73
3D body "0_89-0_89-0_6.stp": height 0.05, standoff -2.15, extent -2.35,-3.62 -1.46,-2.73
3D body "0_89-0_89-0_6.stp": height 0.05, standoff -2.15, extent -1.08,-3.62 -0.19,-2.73
3D body "0_89-0_89-0_6.stp": height 0.05, standoff -2.15, extent 0.19,-3.62 1.08,-2.73
3D body "0_89-0_89-0_6.stp": height 0.05, standoff -2.15, extent 1.46,-3.62 2.35,-2.73
3D body "0_89-0_89-0_6.stp": height 0.05, standoff -2.15, extent 2.73,-3.62 3.62,-2.73
3D body "0_89-0_89-0_6.stp": height 0.05, standoff -2.15, extent 4,-3.62 4.89,-2.73
3D body "0_89-0_89-0_6.stp": height 0.05, standoff -2.15, extent -4.89,-2.35 -4,-1.46
3D body "0_89-0_89-0_6.stp": height 0.05, standoff -2.15, extent -3.62,-2.35 -2.73,-1.46
3D body "0_89-0_89-0_6.stp": height 0.05, standoff -2.15, extent -2.35,-2.35 -1.46,-1.46
3D body "0_89-0_89-0_6.stp": height 0.05, standoff -2.15, extent -1.08,-2.35 -0.19,-1.46
3D body "0_89-0_89-0_6.stp": height 0.05, standoff -2.15, extent 0.19,-2.35 1.08,-1.46
3D body "0_89-0_89-0_6.stp": height 0.05, standoff -2.15, extent 1.46,-2.35 2.35,-1.46
3D body "0_89-0_89-0_6.stp": height 0.05, standoff -2.15, extent 2.73,-2.35 3.62,-1.46
3D body "0_89-0_89-0_6.stp": height 0.05, standoff -2.15, extent 4,-2.35 4.89,-1.46
3D body "0_89-0_89-0_6.stp": height 0.05, standoff -2.15, extent -15.05,-2.35 -14.16,-1.46
3D body "0_89-0_89-0_6.stp": height 0.05, standoff -2.15, extent -13.78,-2.35 -12.89,-1.46
3D body "0_89-0_89-0_6.stp": height 0.05, standoff -2.15, extent -12.51,-2.35 -11.62,-1.46
3D body "0_89-0_89-0_6.stp": height 0.05, standoff -2.15, extent -11.24,-2.35 -10.35,-1.46
3D body "0_89-0_89-0_6.stp": height 0.05, standoff -2.15, extent -9.97,-2.35 -9.08,-1.46
3D body "0_89-0_89-0_6.stp": height 0.05, standoff -2.15, extent -8.7,-2.35 -7.81,-1.46
3D body "0_89-0_89-0_6.stp": height 0.05, standoff -2.15, extent -7.43,-2.35 -6.54,-1.46
3D body "0_89-0_89-0_6.stp": height 0.05, standoff -2.15, extent -6.16,-2.35 -5.27,-1.46
3D body "0_89-0_89-0_6.stp": height 0.05, standoff -2.15, extent -15.05,-3.62 -14.16,-2.73
3D body "0_89-0_89-0_6.stp": height 0.05, standoff -2.15, extent -13.78,-3.62 -12.89,-2.73
3D body "0_89-0_89-0_6.stp": height 0.05, standoff -2.15, extent -12.51,-3.62 -11.62,-2.73
3D body "0_89-0_89-0_6.stp": height 0.05, standoff -2.15, extent -11.24,-3.62 -10.35,-2.73
3D body "0_89-0_89-0_6.stp": height 0.05, standoff -2.15, extent -9.97,-3.62 -9.08,-2.73
3D body "0_89-0_89-0_6.stp": height 0.05, standoff -2.15, extent -8.7,-3.62 -7.81,-2.73
3D body "0_89-0_89-0_6.stp": height 0.05, standoff -2.15, extent -7.43,-3.62 -6.54,-2.73
3D body "0_89-0_89-0_6.stp": height 0.05, standoff -2.15, extent -6.16,-3.62 -5.27,-2.73
3D body "0_89-0_89-0_6.stp": height 0.05, standoff -2.15, extent -25.21,-3.62 -24.32,-2.73
3D body "0_89-0_89-0_6.stp": height 0.05, standoff -2.15, extent -23.94,-3.62 -23.05,-2.73
3D body "0_89-0_89-0_6.stp": height 0.05, standoff -2.15, extent -22.67,-3.62 -21.78,-2.73
3D body "0_89-0_89-0_6.stp": height 0.05, standoff -2.15, extent -21.4,-3.62 -20.51,-2.73
3D body "0_89-0_89-0_6.stp": height 0.05, standoff -2.15, extent -20.13,-3.62 -19.24,-2.73
3D body "0_89-0_89-0_6.stp": height 0.05, standoff -2.15, extent -18.86,-3.62 -17.97,-2.73
3D body "0_89-0_89-0_6.stp": height 0.05, standoff -2.15, extent -17.59,-3.62 -16.7,-2.73
3D body "0_89-0_89-0_6.stp": height 0.05, standoff -2.15, extent -16.32,-3.62 -15.43,-2.73
3D body "0_89-0_89-0_6.stp": height 0.05, standoff -2.15, extent -16.32,-2.35 -15.43,-1.46
3D body "0_89-0_89-0_6.stp": height 0.05, standoff -2.15, extent -17.59,-2.35 -16.7,-1.46
3D body "0_89-0_89-0_6.stp": height 0.05, standoff -2.15, extent -18.86,-2.35 -17.97,-1.46
3D body "0_89-0_89-0_6.stp": height 0.05, standoff -2.15, extent -20.13,-2.35 -19.24,-1.46
3D body "0_89-0_89-0_6.stp": height 0.05, standoff -2.15, extent -21.4,-2.35 -20.51,-1.46
3D body "0_89-0_89-0_6.stp": height 0.05, standoff -2.15, extent -22.67,-2.35 -21.78,-1.46
3D body "0_89-0_89-0_6.stp": height 0.05, standoff -2.15, extent -23.94,-2.35 -23.05,-1.46
3D body "0_89-0_89-0_6.stp": height 0.05, standoff -2.15, extent -25.21,-2.35 -24.32,-1.46

## CE [mm]
Top Overlay:
  lines w0.6: 0,-2.413 cw(c0,0) 0,2.413 ; 2.53,0 4.6,0 ; 4.826,-2.438 cw(c4.826,-0.025) 4.826,2.388
3D body "ce.stp": height 0.02, standoff 0, extent -2.725,-2.725 4.82,2.725

## CON_SAMTEC_SSM_110_X_DV [mm] "CON_SAMTEC_SSM_110_X_DV"
height 11
pads (42):
  rect 1.016x1.905 smd: 1(-11.43,-3.048) 2(-11.43,3.048) 3(-8.89,-3.048) 4(-8.89,3.048) 5(-6.35,-3.048) 6(-6.35,3.048) 7(-3.81,-3.048) 8(-3.81,3.048) 9(-1.27,-3.048) 10(-1.27,3.048) 11(1.27,-3.048) 12(1.27,3.048) 13(3.81,-3.048) 14(3.81,3.048) 15(6.35,-3.048) 16(6.35,3.048) 17(8.89,-3.048) 18(8.89,3.048) 19(11.43,-3.048) 20(11.43,3.048)
  round 0.5 / inner round 1 / far side round 0.5 hole 1: " "(-11.43,-1.27) " "(-11.43,1.27) " "(-8.89,-1.27) " "(-8.89,1.27) " "(-6.35,-1.27) " "(-6.35,1.27) " "(-3.81,-1.27) " "(-3.81,1.27) " "(-1.27,-1.27) " "(-1.27,1.27) " "(1.27,-1.27) " "(1.27,1.27) " "(3.81,-1.27) " "(3.81,1.27) " "(6.35,-1.27) " "(6.35,1.27) " "(8.89,-1.27) " "(8.89,1.27) " "(11.43,-1.27) " "(11.43,1.27)
  round 1 / inner round 1.19 / far side round 1 hole 1.19: " "(-10.16,0) " "(10.16,0)
Top Overlay:
  lines w0.18: -12.065,-2.54 -12.7,-2.54 -12.7,2.54 -12.065,2.54 ; -10.795,-2.54 -9.525,-2.54 -10.16,-2.54 ; -10.795,2.54 -9.525,2.54 ; -8.255,-2.54 -6.985,-2.54 ; -8.255,2.54 -6.985,2.54 ; -5.715,-2.54 -4.445,-2.54 ; -5.715,2.54 -4.445,2.54 ; -3.175,-2.54 -1.905,-2.54 ; -3.175,2.54 -1.905,2.54 ; -0.635,-2.54 0.635,-2.54 ; -0.635,2.54 0.635,2.54 ; 1.905,-2.54 3.175,-2.54 ; 1.905,2.54 3.175,2.54 ; 4.445,-2.54 5.715,-2.54 ; 4.445,2.54 5.715,2.54 ; 6.985,-2.54 8.255,-2.54 ; 6.985,2.54 8.255,2.54 ; 9.525,-2.54 10.795,-2.54 ; 9.525,2.54 10.795,2.54 ; 12.065,-2.54 12.7,-2.54 12.7,2.54 12.065,2.54
  text "19" at 12.3,-4.25 h1.2
  text "20" at 12.3,3 h1.2
  text "2" at -13.05,3 h1.2
  text "1" at -12.8,-4.25 h1.2
Mechanical 6:
  lines w0.18: -12.228,-2.54 -12.7,-2.54 -12.7,2.54 -12.228,2.54 ; -10.632,-2.54 -9.688,-2.54 -10.16,-2.54 ; -10.632,2.54 -9.688,2.54 ; -8.092,-2.54 -7.148,-2.54 ; -8.092,2.54 -7.148,2.54 ; -5.552,-2.54 -4.608,-2.54 ; -5.552,2.54 -4.608,2.54 ; -3.012,-2.54 -2.068,-2.54 ; -3.012,2.54 -2.068,2.54 ; -0.472,-2.54 0.472,-2.54 ; -0.472,2.54 0.472,2.54 ; 2.068,-2.54 3.012,-2.54 ; 2.068,2.54 3.012,2.54 ; 4.608,-2.54 5.552,-2.54 ; 4.608,2.54 5.552,2.54 ; 7.148,-2.54 8.092,-2.54 ; 7.148,2.54 8.092,2.54 ; 9.688,-2.54 10.632,-2.54 ; 9.688,2.54 10.632,2.54 ; 12.228,-2.54 12.7,-2.54 12.7,2.54 12.228,2.54
  text "1" at -12.8,-4.25 h1.2
  text "2" at -13.05,3 h1.2
  text "20" at 12.3,3 h1.2
  text "19" at 12.3,-4.25 h1.2
Mechanical 8:
  lines w0.025: -15.49,-2.54 -12.95,-2.54 ; -15.49,2.54 -12.95,2.54 -14.22,2.54 ; -14.22,0 -10.41,0 ; -10.16,-6.6 -10.16,-0.25 ; -8.89,-6.6 -8.89,-1.52 ; 11.68,-3.048 14.45,-3.048 ; 11.68,3.048 14.45,3.048 ; 14.075,-2.548 14.2,-3.048 ; 14.075,2.548 14.2,3.048 ; 14.325,-2.548 14.2,-3.048 ; 14.325,2.548 14.2,3.048 ; 14.2,-3.048 14.2,3.048 ; 14.2,-3.048 14.2,3.048
Mechanical 16:
  drawing of 118 lines, arcs and shapes, not listed
Multi-Layer keep-out:
  circle w0.025: c-8.89,-1.27 r1.016
  circle w0.025: c-11.43,-1.27 r1.016
  circle w0.025: c-11.43,1.27 r1.016
  circle w0.025: c-8.89,1.27 r1.016
  circle w0.025: c-3.81,-1.27 r1.016
  circle w0.025: c-6.35,-1.27 r1.016
  circle w0.025: c-6.35,1.27 r1.016
  circle w0.025: c-3.81,1.27 r1.016
  circle w0.025: c-1.27,1.27 r1.016
  circle w0.025: c-1.27,-1.27 r1.016
  circle w0.025: c1.27,-1.27 r1.016
  circle w0.025: c1.27,1.27 r1.016
  circle w0.025: c3.81,1.27 r1.016
  circle w0.025: c6.35,1.27 r1.016
  circle w0.025: c6.35,-1.27 r1.016
  circle w0.025: c8.89,-1.27 r1.016
  circle w0.025: c8.89,1.27 r1.016
  circle w0.025: c11.43,-1.27 r1.016
  circle w0.025: c11.43,1.27 r1.016
  circle w0.025: c3.81,-1.27 r1.016
  circle w0.025: c10.16,0 r1.19
  circle w0.025: c-10.16,0 r1.19
Mechanical 18:
  text "11" at 0.87,-3.048 h0.5
  text "12" at 0.87,3.048 h0.5
  text "19" at 11.03,-3.048 h0.5
  text "20" at 11.03,3.048 h0.5
  text "13" at 3.41,-3.048 h0.5
  text "15" at 5.95,-3.048 h0.5
  text "17" at 8.49,-3.048 h0.5
  text "6" at -6.55,3.048 h0.5
  text "14" at 3.41,3.048 h0.5
  text "18" at 8.49,3.048 h0.5
  text "5" at -6.55,-3.048 h0.5
  text "9" at -1.47,-3.048 h0.5
  text "16" at 5.95,3.048 h0.5
  text "1" at -11.63,-3.048 h0.5
  text "4" at -9.09,3.048 h0.5
  text "3" at -9.09,-3.048 h0.5
  text "2" at -11.63,3.048 h0.5
  text "7" at -4.01,-3.048 h0.5
  text "8" at -4.01,3.048 h0.5
  text "10" at -1.67,3.048 h0.5
Mechanical 20:
  text "20" at 10.16,0.635 h1.12
  text "2" at -12.065,0.635 h1.12
  text "19" at 10.16,-1.905 h1.12
  text "1" at -12.065,-1.905 h1.12
  text "PARTNUM" at -5.04,-0.953 h1.8
  text "TOLERANCE" at -6.48,-0.953 h1.8
  text "HDR_2x10_SMT" at -8.64,-0.953 h1.8
Mechanical 24:
  text "PERC: 1mm19 +0.08 -0.00" at -5.8,-8.04 h0.5
  text "DOC : SAMTEC" at -5.8,-9.54 h0.5
  text "HGT : 7.40mm" at -5.8,-8.79 h0.5
  text "PAD : 1mm016x1mm905 tnm1mm19_01 tnm1mm0" at -5.8,-7.29 h0.5
  text "NAME: CON_SAMTEC_SSM_110_X_DV" at -5.8,-6.54 h0.5
3D body "p190-100.stp": height 0.02, standoff 0, extent 10.93,2.098 11.93,3.998
3D body "p190-100.stp": height 0.02, standoff 0, extent 10.93,-3.998 11.93,-2.098
3D body "p190-100.stp": height 0.02, standoff 0, extent 8.39,-3.998 9.39,-2.098
3D body "p190-100.stp": height 0.02, standoff 0, extent 8.39,2.098 9.39,3.998
3D body "p190-100.stp": height 0.02, standoff 0, extent 5.85,2.098 6.85,3.998
3D body "p190-100.stp": height 0.02, standoff 0, extent 5.85,-3.998 6.85,-2.098
3D body "p190-100.stp": height 0.02, standoff 0, extent 3.31,2.098 4.31,3.998
3D body "p190-100.stp": height 0.02, standoff 0, extent 3.31,-3.998 4.31,-2.098
3D body "p190-100.stp": height 0.02, standoff 0, extent 0.77,2.098 1.77,3.998
3D body "p190-100.stp": height 0.02, standoff 0, extent 0.77,-3.998 1.77,-2.098
3D body "p190-100.stp": height 0.02, standoff 0, extent -1.77,2.098 -0.77,3.998
3D body "p190-100.stp": height 0.02, standoff 0, extent -1.77,-3.998 -0.77,-2.098
3D body "p190-100.stp": height 0.02, standoff 0, extent -4.31,-3.998 -3.31,-2.098
3D body "p190-100.stp": height 0.02, standoff 0, extent -6.85,-3.998 -5.85,-2.098
3D body "p190-100.stp": height 0.02, standoff 0, extent -9.39,-3.998 -8.39,-2.098
3D body "p190-100.stp": height 0.02, standoff 0, extent -11.93,-3.998 -10.93,-2.098
3D body "p190-100.stp": height 0.02, standoff 0, extent -6.85,2.098 -5.85,3.998
3D body "p190-100.stp": height 0.02, standoff 0, extent -4.31,2.098 -3.31,3.998
3D body "p190-100.stp": height 0.02, standoff 0, extent -6.85,2.098 -5.85,3.998
3D body "p190-100.stp": height 0.02, standoff 0, extent -9.39,2.098 -8.39,3.998
3D body "p190-100.stp": height 0.02, standoff 0, extent -11.93,2.098 -10.93,3.998